# Altium schematic symbol library jlcpcb_2025_04_capacitors_extended_0805.schlib: 3281 symbols (part 9 of 18) (continued)
## CC0805JRX7R0BB472
designator C?  Capacitance: 4.7nF  (hidden comment: *)
Capacitor, Ceramic (MLCC), 4.7nF, ±5%, 100V, X7R, ±5%, SMD 0805; Manufacturer: YAGEO; Manufacturer Part Number: CC0805JRX7R0BB472; Package Size: 0805; JLCPCB Basic Part: No; JLCPCB Part Number: C309489; Supplier 1: LCSC; Category: Capacitors - MLCC; Supplier Part Number 1: C309489; Tolerance: ±5%; Voltage Rating: 100V; Temperature Coefficient: X7R; RoHS: Yes; ComponentLink1Description: Datasheet; ComponentLink1URL: https://wmsc.lcsc.com/wmsc/upload/file/pdf/v2/lcsc/2304140030_YAGEO-CC0805JRX7R0BB472_C309489.pdf; ComponentLink2Description: JLCPCB Part URL; ComponentLink2URL: https://jlcpcb.com/partdetail/C309489; ComponentLink3Description: LCSC Part URL; ComponentLink3URL: https://lcsc.com/product-detail/Multilayer-Ceramic-Capacitors-MLCC---SMD-SMT_YAGEO-YAGEO-CC0805JRX7R0BB472_C309489.html
footprint CAP-0805 (0805 (2012M) Capacitor)
pins: 1, 2

## CC0805JRX7R0BB822
designator C?  Capacitance: 8200pF  (hidden comment: *)
Capacitor, Ceramic (MLCC), 8200pF, ±5%, 100V, X7R, ±5%, SMD 0805; Manufacturer: YAGEO; Manufacturer Part Number: CC0805JRX7R0BB822; Package Size: 0805; JLCPCB Basic Part: No; JLCPCB Part Number: C576998; Supplier 1: LCSC; Category: Capacitors - MLCC; Supplier Part Number 1: C576998; Tolerance: ±5%; Voltage Rating: 100V; Temperature Coefficient: X7R; RoHS: Yes; ComponentLink1Description: Datasheet; ComponentLink1URL: https://wmsc.lcsc.com/wmsc/upload/file/pdf/v2/lcsc/2211281000_YAGEO-CC0805JRX7R0BB822_C576998.pdf; ComponentLink2Description: JLCPCB Part URL; ComponentLink2URL: https://jlcpcb.com/partdetail/C576998; ComponentLink3Description: LCSC Part URL; ComponentLink3URL: https://lcsc.com/product-detail/Multilayer-Ceramic-Capacitors-MLCC---SMD-SMT_YAGEO-YAGEO-CC0805JRX7R0BB822_C576998.html
footprint CAP-0805 (0805 (2012M) Capacitor)
pins: 1, 2

## CC0805JRX7R7BB104
designator C?  Capacitance: 100nF  (hidden comment: *)
Capacitor, Ceramic (MLCC), 100nF, ±5%, 16V, X7R, ±5%, SMD 0805; Manufacturer: YAGEO; Manufacturer Part Number: CC0805JRX7R7BB104; Package Size: 0805; JLCPCB Basic Part: No; JLCPCB Part Number: C520082; Supplier 1: LCSC; Category: Capacitors - MLCC; Supplier Part Number 1: C520082; Tolerance: ±5%; Voltage Rating: 16V; Temperature Coefficient: X7R; RoHS: Yes; ComponentLink1Description: Datasheet; ComponentLink1URL: https://wmsc.lcsc.com/wmsc/upload/file/pdf/v2/lcsc/2203311630_YAGEO-CC0805JRX7R7BB104_C520082.pdf; ComponentLink2Description: JLCPCB Part URL; ComponentLink2URL: https://jlcpcb.com/partdetail/C520082; ComponentLink3Description: LCSC Part URL; ComponentLink3URL: https://lcsc.com/product-detail/Multilayer-Ceramic-Capacitors-MLCC---SMD-SMT_YAGEO-YAGEO-CC0805JRX7R7BB104_C520082.html
footprint CAP-0805 (0805 (2012M) Capacitor)
pins: 1, 2

## CC0805JRX7R7BB224
designator C?  Capacitance: 220nF  (hidden comment: *)
Capacitor, Ceramic (MLCC), 220nF, ±5%, 16V, X7R, ±5%, SMD 0805; Manufacturer: YAGEO; Manufacturer Part Number: CC0805JRX7R7BB224; Package Size: 0805; JLCPCB Basic Part: No; JLCPCB Part Number: C541526; Supplier 1: LCSC; Category: Capacitors - MLCC; Supplier Part Number 1: C541526; Tolerance: ±5%; Voltage Rating: 16V; Temperature Coefficient: X7R; RoHS: Yes; ComponentLink1Description: Datasheet; ComponentLink1URL: https://wmsc.lcsc.com/wmsc/upload/file/pdf/v2/lcsc/2006151143_YAGEO-CC0805JRX7R7BB224_C541526.pdf; ComponentLink2Description: JLCPCB Part URL; ComponentLink2URL: https://jlcpcb.com/partdetail/C541526; ComponentLink3Description: LCSC Part URL; ComponentLink3URL: https://lcsc.com/product-detail/Multilayer-Ceramic-Capacitors-MLCC---SMD-SMT_YAGEO-YAGEO-CC0805JRX7R7BB224_C541526.html
footprint CAP-0805 (0805 (2012M) Capacitor)
pins: 1, 2

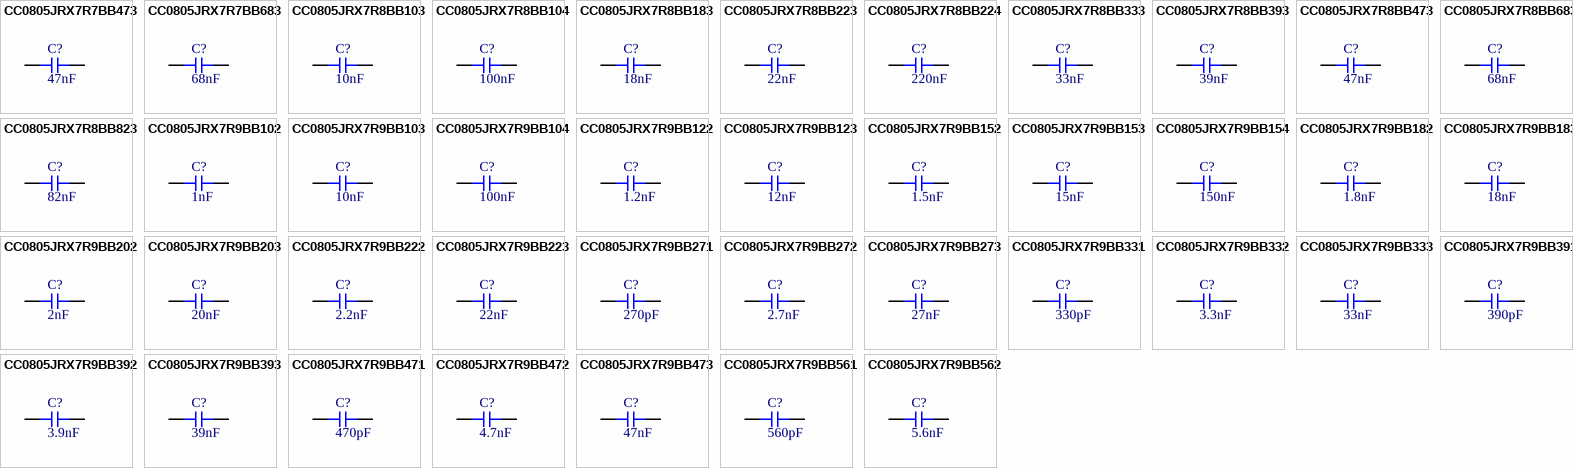
[diagram p38: symbols CC0805JRX7R7BB473 to CC0805JRX7R9BB562]

## CC0805JRX7R7BB473
designator C?  Capacitance: 47nF  (hidden comment: *)
Capacitor, Ceramic (MLCC), 47nF, ±5%, 16V, X7R, ±5%, SMD 0805; Manufacturer: YAGEO; Manufacturer Part Number: CC0805JRX7R7BB473; Package Size: 0805; JLCPCB Basic Part: No; JLCPCB Part Number: C520035; Supplier 1: LCSC; Category: Capacitors - MLCC; Supplier Part Number 1: C520035; Tolerance: ±5%; Voltage Rating: 16V; Temperature Coefficient: X7R; RoHS: Yes; ComponentLink1Description: Datasheet; ComponentLink1URL: https://wmsc.lcsc.com/wmsc/upload/file/pdf/v2/lcsc/2008191833_YAGEO-CC0805JRX7R7BB473_C520035.pdf; ComponentLink2Description: JLCPCB Part URL; ComponentLink2URL: https://jlcpcb.com/partdetail/C520035; ComponentLink3Description: LCSC Part URL; ComponentLink3URL: https://lcsc.com/product-detail/Multilayer-Ceramic-Capacitors-MLCC---SMD-SMT_YAGEO-YAGEO-CC0805JRX7R7BB473_C520035.html
footprint CAP-0805 (0805 (2012M) Capacitor)
pins: 1, 2

## CC0805JRX7R7BB683
designator C?  Capacitance: 68nF  (hidden comment: *)
Capacitor, Ceramic (MLCC), 68nF, ±5%, 16V, X7R, ±5%, SMD 0805; Manufacturer: YAGEO; Manufacturer Part Number: CC0805JRX7R7BB683; Package Size: 0805; JLCPCB Basic Part: No; JLCPCB Part Number: C520036; Supplier 1: LCSC; Category: Capacitors - MLCC; Supplier Part Number 1: C520036; Tolerance: ±5%; Voltage Rating: 16V; Temperature Coefficient: X7R; RoHS: Yes; ComponentLink1Description: Datasheet; ComponentLink1URL: https://wmsc.lcsc.com/wmsc/upload/file/pdf/v2/lcsc/2006011836_YAGEO-CC0805JRX7R7BB683_C520036.pdf; ComponentLink2Description: JLCPCB Part URL; ComponentLink2URL: https://jlcpcb.com/partdetail/C520036; ComponentLink3Description: LCSC Part URL; ComponentLink3URL: https://lcsc.com/product-detail/Multilayer-Ceramic-Capacitors-MLCC---SMD-SMT_YAGEO-YAGEO-CC0805JRX7R7BB683_C520036.html
footprint CAP-0805 (0805 (2012M) Capacitor)
pins: 1, 2

## CC0805JRX7R8BB103
designator C?  Capacitance: 10nF  (hidden comment: *)
Capacitor, Ceramic (MLCC), 10nF, ±5%, 25V, X7R, ±5%, SMD 0805; Manufacturer: YAGEO; Manufacturer Part Number: CC0805JRX7R8BB103; Package Size: 0805; JLCPCB Basic Part: No; JLCPCB Part Number: C520009; Supplier 1: LCSC; Category: Capacitors - MLCC; Supplier Part Number 1: C520009; Tolerance: ±5%; Voltage Rating: 25V; Temperature Coefficient: X7R; RoHS: Yes; ComponentLink1Description: Datasheet; ComponentLink1URL: https://wmsc.lcsc.com/wmsc/upload/file/pdf/v2/lcsc/2005181835_YAGEO-CC0805JRX7R8BB103_C520009.pdf; ComponentLink2Description: JLCPCB Part URL; ComponentLink2URL: https://jlcpcb.com/partdetail/C520009; ComponentLink3Description: LCSC Part URL; ComponentLink3URL: https://lcsc.com/product-detail/Multilayer-Ceramic-Capacitors-MLCC---SMD-SMT_YAGEO-YAGEO-CC0805JRX7R8BB103_C520009.html
footprint CAP-0805 (0805 (2012M) Capacitor)
pins: 1, 2

## CC0805JRX7R8BB104
designator C?  Capacitance: 100nF  (hidden comment: *)
Capacitor, Ceramic (MLCC), 100nF, ±5%, 25V, X7R, ±5%, SMD 0805; Manufacturer: YAGEO; Manufacturer Part Number: CC0805JRX7R8BB104; Package Size: 0805; JLCPCB Basic Part: No; JLCPCB Part Number: C520083; Supplier 1: LCSC; Category: Capacitors - MLCC; Supplier Part Number 1: C520083; Tolerance: ±5%; Voltage Rating: 25V; Temperature Coefficient: X7R; RoHS: Yes; ComponentLink1Description: Datasheet; ComponentLink1URL: https://wmsc.lcsc.com/wmsc/upload/file/pdf/v2/lcsc/2203311630_YAGEO-CC0805JRX7R8BB104_C520083.pdf; ComponentLink2Description: JLCPCB Part URL; ComponentLink2URL: https://jlcpcb.com/partdetail/C520083; ComponentLink3Description: LCSC Part URL; ComponentLink3URL: https://lcsc.com/product-detail/Multilayer-Ceramic-Capacitors-MLCC---SMD-SMT_YAGEO-YAGEO-CC0805JRX7R8BB104_C520083.html
footprint CAP-0805 (0805 (2012M) Capacitor)
pins: 1, 2

## CC0805JRX7R8BB183
designator C?  Capacitance: 18nF  (hidden comment: *)
Capacitor, Ceramic (MLCC), 18nF, ±5%, 25V, X7R, ±5%, SMD 0805; Manufacturer: YAGEO; Manufacturer Part Number: CC0805JRX7R8BB183; Package Size: 0805; JLCPCB Basic Part: No; JLCPCB Part Number: C520030; Supplier 1: LCSC; Category: Capacitors - MLCC; Supplier Part Number 1: C520030; Tolerance: ±5%; Voltage Rating: 25V; Temperature Coefficient: X7R; RoHS: Yes; ComponentLink1Description: Datasheet; ComponentLink1URL: https://wmsc.lcsc.com/wmsc/upload/file/pdf/v2/lcsc/2012162139_YAGEO-CC0805JRX7R8BB183_C520030.pdf; ComponentLink2Description: JLCPCB Part URL; ComponentLink2URL: https://jlcpcb.com/partdetail/C520030; ComponentLink3Description: LCSC Part URL; ComponentLink3URL: https://lcsc.com/product-detail/Multilayer-Ceramic-Capacitors-MLCC---SMD-SMT_YAGEO-YAGEO-CC0805JRX7R8BB183_C520030.html
footprint CAP-0805 (0805 (2012M) Capacitor)
pins: 1, 2

## CC0805JRX7R8BB223
designator C?  Capacitance: 22nF  (hidden comment: *)
Capacitor, Ceramic (MLCC), 22nF, ±5%, 25V, X7R, ±5%, SMD 0805; Manufacturer: YAGEO; Manufacturer Part Number: CC0805JRX7R8BB223; Package Size: 0805; JLCPCB Basic Part: No; JLCPCB Part Number: C520037; Supplier 1: LCSC; Category: Capacitors - MLCC; Supplier Part Number 1: C520037; Tolerance: ±5%; Voltage Rating: 25V; Temperature Coefficient: X7R; RoHS: Yes; ComponentLink1Description: Datasheet; ComponentLink1URL: https://wmsc.lcsc.com/wmsc/upload/file/pdf/v2/lcsc/2008031233_YAGEO-CC0805JRX7R8BB223_C520037.pdf; ComponentLink2Description: JLCPCB Part URL; ComponentLink2URL: https://jlcpcb.com/partdetail/C520037; ComponentLink3Description: LCSC Part URL; ComponentLink3URL: https://lcsc.com/product-detail/Multilayer-Ceramic-Capacitors-MLCC---SMD-SMT_YAGEO-YAGEO-CC0805JRX7R8BB223_C520037.html
footprint CAP-0805 (0805 (2012M) Capacitor)
pins: 1, 2

## CC0805JRX7R8BB224
designator C?  Capacitance: 220nF  (hidden comment: *)
Capacitor, Ceramic (MLCC), 220nF, ±5%, 25V, X7R, ±5%, SMD 0805; Manufacturer: YAGEO; Manufacturer Part Number: CC0805JRX7R8BB224; Package Size: 0805; JLCPCB Basic Part: No; JLCPCB Part Number: C541527; Supplier 1: LCSC; Category: Capacitors - MLCC; Supplier Part Number 1: C541527; Tolerance: ±5%; Voltage Rating: 25V; Temperature Coefficient: X7R; RoHS: Yes; ComponentLink1Description: Datasheet; ComponentLink1URL: https://wmsc.lcsc.com/wmsc/upload/file/pdf/v2/lcsc/2006151143_YAGEO-CC0805JRX7R8BB224_C541527.pdf; ComponentLink2Description: JLCPCB Part URL; ComponentLink2URL: https://jlcpcb.com/partdetail/C541527; ComponentLink3Description: LCSC Part URL; ComponentLink3URL: https://lcsc.com/product-detail/Multilayer-Ceramic-Capacitors-MLCC---SMD-SMT_YAGEO-YAGEO-CC0805JRX7R8BB224_C541527.html
footprint CAP-0805 (0805 (2012M) Capacitor)
pins: 1, 2

## CC0805JRX7R8BB333
designator C?  Capacitance: 33nF  (hidden comment: *)
Capacitor, Ceramic (MLCC), 33nF, ±5%, 25V, X7R, ±5%, SMD 0805; Manufacturer: YAGEO; Manufacturer Part Number: CC0805JRX7R8BB333; Package Size: 0805; JLCPCB Basic Part: No; JLCPCB Part Number: C520038; Supplier 1: LCSC; Category: Capacitors - MLCC; Supplier Part Number 1: C520038; Tolerance: ±5%; Voltage Rating: 25V; Temperature Coefficient: X7R; RoHS: Yes; ComponentLink1Description: Datasheet; ComponentLink1URL: https://wmsc.lcsc.com/wmsc/upload/file/pdf/v2/lcsc/2007231535_YAGEO-CC0805JRX7R8BB333_C520038.pdf; ComponentLink2Description: JLCPCB Part URL; ComponentLink2URL: https://jlcpcb.com/partdetail/C520038; ComponentLink3Description: LCSC Part URL; ComponentLink3URL: https://lcsc.com/product-detail/Multilayer-Ceramic-Capacitors-MLCC---SMD-SMT_YAGEO-YAGEO-CC0805JRX7R8BB333_C520038.html
footprint CAP-0805 (0805 (2012M) Capacitor)
pins: 1, 2

## CC0805JRX7R8BB393
designator C?  Capacitance: 39nF  (hidden comment: *)
Capacitor, Ceramic (MLCC), 39nF, ±5%, 25V, X7R, ±5%, SMD 0805; Manufacturer: YAGEO; Manufacturer Part Number: CC0805JRX7R8BB393; Package Size: 0805; JLCPCB Basic Part: No; JLCPCB Part Number: C1853547; Supplier 1: LCSC; Category: Capacitors - MLCC; Supplier Part Number 1: C1853547; Tolerance: ±5%; Voltage Rating: 25V; Temperature Coefficient: X7R; RoHS: Yes; ComponentLink1Description: Datasheet; ComponentLink1URL: https://wmsc.lcsc.com/wmsc/upload/file/pdf/v2/lcsc/2201271100_YAGEO-CC0805JRX7R8BB393_C1853547.pdf; ComponentLink2Description: JLCPCB Part URL; ComponentLink2URL: https://jlcpcb.com/partdetail/C1853547; ComponentLink3Description: LCSC Part URL; ComponentLink3URL: https://lcsc.com/product-detail/Multilayer-Ceramic-Capacitors-MLCC---SMD-SMT_YAGEO-YAGEO-CC0805JRX7R8BB393_C1853547.html
footprint CAP-0805 (0805 (2012M) Capacitor)
pins: 1, 2

## CC0805JRX7R8BB473
designator C?  Capacitance: 47nF  (hidden comment: *)
Capacitor, Ceramic (MLCC), 47nF, ±5%, 25V, X7R, ±5%, SMD 0805; Manufacturer: YAGEO; Manufacturer Part Number: CC0805JRX7R8BB473; Package Size: 0805; JLCPCB Basic Part: No; JLCPCB Part Number: C520039; Supplier 1: LCSC; Category: Capacitors - MLCC; Supplier Part Number 1: C520039; Tolerance: ±5%; Voltage Rating: 25V; Temperature Coefficient: X7R; RoHS: Yes; ComponentLink1Description: Datasheet; ComponentLink1URL: https://wmsc.lcsc.com/wmsc/upload/file/pdf/v2/lcsc/2008191833_YAGEO-CC0805JRX7R8BB473_C520039.pdf; ComponentLink2Description: JLCPCB Part URL; ComponentLink2URL: https://jlcpcb.com/partdetail/C520039; ComponentLink3Description: LCSC Part URL; ComponentLink3URL: https://lcsc.com/product-detail/Multilayer-Ceramic-Capacitors-MLCC---SMD-SMT_YAGEO-YAGEO-CC0805JRX7R8BB473_C520039.html
footprint CAP-0805 (0805 (2012M) Capacitor)
pins: 1, 2

## CC0805JRX7R8BB683
designator C?  Capacitance: 68nF  (hidden comment: *)
Capacitor, Ceramic (MLCC), 68nF, ±5%, 25V, X7R, ±5%, SMD 0805; Manufacturer: YAGEO; Manufacturer Part Number: CC0805JRX7R8BB683; Package Size: 0805; JLCPCB Basic Part: No; JLCPCB Part Number: C520040; Supplier 1: LCSC; Category: Capacitors - MLCC; Supplier Part Number 1: C520040; Tolerance: ±5%; Voltage Rating: 25V; Temperature Coefficient: X7R; RoHS: Yes; ComponentLink1Description: Datasheet; ComponentLink1URL: https://wmsc.lcsc.com/wmsc/upload/file/pdf/v2/lcsc/2006011836_YAGEO-CC0805JRX7R8BB683_C520040.pdf; ComponentLink2Description: JLCPCB Part URL; ComponentLink2URL: https://jlcpcb.com/partdetail/C520040; ComponentLink3Description: LCSC Part URL; ComponentLink3URL: https://lcsc.com/product-detail/Multilayer-Ceramic-Capacitors-MLCC---SMD-SMT_YAGEO-YAGEO-CC0805JRX7R8BB683_C520040.html
footprint CAP-0805 (0805 (2012M) Capacitor)
pins: 1, 2

## CC0805JRX7R8BB823
designator C?  Capacitance: 82nF  (hidden comment: *)
Capacitor, Ceramic (MLCC), 82nF, ±5%, 25V, X7R, ±5%, SMD 0805; Manufacturer: YAGEO; Manufacturer Part Number: CC0805JRX7R8BB823; Package Size: 0805; JLCPCB Basic Part: No; JLCPCB Part Number: C520041; Supplier 1: LCSC; Category: Capacitors - MLCC; Supplier Part Number 1: C520041; Tolerance: ±5%; Voltage Rating: 25V; Temperature Coefficient: X7R; RoHS: Yes; ComponentLink1Description: Datasheet; ComponentLink1URL: https://wmsc.lcsc.com/wmsc/upload/file/pdf/v2/lcsc/2012162139_YAGEO-CC0805JRX7R8BB823_C520041.pdf; ComponentLink2Description: JLCPCB Part URL; ComponentLink2URL: https://jlcpcb.com/partdetail/C520041; ComponentLink3Description: LCSC Part URL; ComponentLink3URL: https://lcsc.com/product-detail/Multilayer-Ceramic-Capacitors-MLCC---SMD-SMT_YAGEO-YAGEO-CC0805JRX7R8BB823_C520041.html
footprint CAP-0805 (0805 (2012M) Capacitor)
pins: 1, 2

## CC0805JRX7R9BB102
designator C?  Capacitance: 1nF  (hidden comment: *)
Capacitor, Ceramic (MLCC), 1nF, ±5%, 50V, X7R, ±5%, SMD 0805; Manufacturer: YAGEO; Manufacturer Part Number: CC0805JRX7R9BB102; Package Size: 0805; JLCPCB Basic Part: No; JLCPCB Part Number: C277515; Supplier 1: LCSC; Category: Capacitors - MLCC; Supplier Part Number 1: C277515; Tolerance: ±5%; Voltage Rating: 50V; Temperature Coefficient: X7R; RoHS: Yes; ComponentLink1Description: Datasheet; ComponentLink1URL: https://wmsc.lcsc.com/wmsc/upload/file/pdf/v2/lcsc/2304140030_YAGEO-CC0805JRX7R9BB102_C277515.pdf; ComponentLink2Description: JLCPCB Part URL; ComponentLink2URL: https://jlcpcb.com/partdetail/C277515; ComponentLink3Description: LCSC Part URL; ComponentLink3URL: https://lcsc.com/product-detail/Multilayer-Ceramic-Capacitors-MLCC---SMD-SMT_YAGEO-YAGEO-CC0805JRX7R9BB102_C277515.html
footprint CAP-0805 (0805 (2012M) Capacitor)
pins: 1, 2

## CC0805JRX7R9BB103
designator C?  Capacitance: 10nF  (hidden comment: *)
Capacitor, Ceramic (MLCC), 10nF, ±5%, 50V, X7R, ±5%, SMD 0805; Manufacturer: YAGEO; Manufacturer Part Number: CC0805JRX7R9BB103; Package Size: 0805; JLCPCB Basic Part: No; JLCPCB Part Number: C58456; Supplier 1: LCSC; Category: Capacitors - MLCC; Supplier Part Number 1: C58456; Tolerance: ±5%; Voltage Rating: 50V; Temperature Coefficient: X7R; RoHS: Yes; ComponentLink1Description: Datasheet; ComponentLink1URL: https://wmsc.lcsc.com/wmsc/upload/file/pdf/v2/lcsc/2304140030_YAGEO-CC0805JRX7R9BB103_C58456.pdf; ComponentLink2Description: JLCPCB Part URL; ComponentLink2URL: https://jlcpcb.com/partdetail/C58456; ComponentLink3Description: LCSC Part URL; ComponentLink3URL: https://lcsc.com/product-detail/Multilayer-Ceramic-Capacitors-MLCC---SMD-SMT_YAGEO-YAGEO-CC0805JRX7R9BB103_C58456.html
footprint CAP-0805 (0805 (2012M) Capacitor)
pins: 1, 2

## CC0805JRX7R9BB104
designator C?  Capacitance: 100nF  (hidden comment: *)
Capacitor, Ceramic (MLCC), 100nF, ±5%, 50V, X7R, ±5%, SMD 0805; Manufacturer: YAGEO; Manufacturer Part Number: CC0805JRX7R9BB104; Package Size: 0805; JLCPCB Basic Part: No; JLCPCB Part Number: C111492; Supplier 1: LCSC; Category: Capacitors - MLCC; Supplier Part Number 1: C111492; Tolerance: ±5%; Voltage Rating: 50V; Temperature Coefficient: X7R; RoHS: Yes; ComponentLink1Description: Datasheet; ComponentLink1URL: https://wmsc.lcsc.com/wmsc/upload/file/pdf/v2/lcsc/1811061632_YAGEO-CC0805JRX7R9BB104_C111492.pdf; ComponentLink2Description: JLCPCB Part URL; ComponentLink2URL: https://jlcpcb.com/partdetail/C111492; ComponentLink3Description: LCSC Part URL; ComponentLink3URL: https://lcsc.com/product-detail/Multilayer-Ceramic-Capacitors-MLCC---SMD-SMT_YAGEO-YAGEO-CC0805JRX7R9BB104_C111492.html
footprint CAP-0805 (0805 (2012M) Capacitor)
pins: 1, 2

## CC0805JRX7R9BB122
designator C?  Capacitance: 1.2nF  (hidden comment: *)
Capacitor, Ceramic (MLCC), 1.2nF, ±5%, 50V, X7R, ±5%, SMD 0805; Manufacturer: YAGEO; Manufacturer Part Number: CC0805JRX7R9BB122; Package Size: 0805; JLCPCB Basic Part: No; JLCPCB Part Number: C520020; Supplier 1: LCSC; Category: Capacitors - MLCC; Supplier Part Number 1: C520020; Tolerance: ±5%; Voltage Rating: 50V; Temperature Coefficient: X7R; RoHS: Yes; ComponentLink1Description: Datasheet; ComponentLink1URL: https://wmsc.lcsc.com/wmsc/upload/file/pdf/v2/lcsc/2007231534_YAGEO-CC0805JRX7R9BB122_C520020.pdf; ComponentLink2Description: JLCPCB Part URL; ComponentLink2URL: https://jlcpcb.com/partdetail/C520020; ComponentLink3Description: LCSC Part URL; ComponentLink3URL: https://lcsc.com/product-detail/Multilayer-Ceramic-Capacitors-MLCC---SMD-SMT_YAGEO-YAGEO-CC0805JRX7R9BB122_C520020.html
footprint CAP-0805 (0805 (2012M) Capacitor)
pins: 1, 2

## CC0805JRX7R9BB123
designator C?  Capacitance: 12nF  (hidden comment: *)
Capacitor, Ceramic (MLCC), 12nF, ±5%, 50V, X7R, ±5%, SMD 0805; Manufacturer: YAGEO; Manufacturer Part Number: CC0805JRX7R9BB123; Package Size: 0805; JLCPCB Basic Part: No; JLCPCB Part Number: C520031; Supplier 1: LCSC; Category: Capacitors - MLCC; Supplier Part Number 1: C520031; Tolerance: ±5%; Voltage Rating: 50V; Temperature Coefficient: X7R; RoHS: Yes; ComponentLink1Description: Datasheet; ComponentLink1URL: https://wmsc.lcsc.com/wmsc/upload/file/pdf/v2/lcsc/2006011836_YAGEO-CC0805JRX7R9BB123_C520031.pdf; ComponentLink2Description: JLCPCB Part URL; ComponentLink2URL: https://jlcpcb.com/partdetail/C520031; ComponentLink3Description: LCSC Part URL; ComponentLink3URL: https://lcsc.com/product-detail/Multilayer-Ceramic-Capacitors-MLCC---SMD-SMT_YAGEO-YAGEO-CC0805JRX7R9BB123_C520031.html
footprint CAP-0805 (0805 (2012M) Capacitor)
pins: 1, 2

## CC0805JRX7R9BB152
designator C?  Capacitance: 1.5nF  (hidden comment: *)
Capacitor, Ceramic (MLCC), 1.5nF, ±5%, 50V, X7R, ±5%, SMD 0805; Manufacturer: YAGEO; Manufacturer Part Number: CC0805JRX7R9BB152; Package Size: 0805; JLCPCB Basic Part: No; JLCPCB Part Number: C520010; Supplier 1: LCSC; Category: Capacitors - MLCC; Supplier Part Number 1: C520010; Tolerance: ±5%; Voltage Rating: 50V; Temperature Coefficient: X7R; RoHS: Yes; ComponentLink1Description: Datasheet; ComponentLink1URL: https://wmsc.lcsc.com/wmsc/upload/file/pdf/v2/lcsc/2007231534_YAGEO-CC0805JRX7R9BB152_C520010.pdf; ComponentLink2Description: JLCPCB Part URL; ComponentLink2URL: https://jlcpcb.com/partdetail/C520010; ComponentLink3Description: LCSC Part URL; ComponentLink3URL: https://lcsc.com/product-detail/Multilayer-Ceramic-Capacitors-MLCC---SMD-SMT_YAGEO-YAGEO-CC0805JRX7R9BB152_C520010.html
footprint CAP-0805 (0805 (2012M) Capacitor)
pins: 1, 2

## CC0805JRX7R9BB153
designator C?  Capacitance: 15nF  (hidden comment: *)
Capacitor, Ceramic (MLCC), 15nF, ±5%, 50V, X7R, ±5%, SMD 0805; Manufacturer: YAGEO; Manufacturer Part Number: CC0805JRX7R9BB153; Package Size: 0805; JLCPCB Basic Part: No; JLCPCB Part Number: C520016; Supplier 1: LCSC; Category: Capacitors - MLCC; Supplier Part Number 1: C520016; Tolerance: ±5%; Voltage Rating: 50V; Temperature Coefficient: X7R; RoHS: Yes; ComponentLink1Description: Datasheet; ComponentLink1URL: https://wmsc.lcsc.com/wmsc/upload/file/pdf/v2/lcsc/2005141204_YAGEO-CC0805JRX7R9BB153_C520016.pdf; ComponentLink2Description: JLCPCB Part URL; ComponentLink2URL: https://jlcpcb.com/partdetail/C520016; ComponentLink3Description: LCSC Part URL; ComponentLink3URL: https://lcsc.com/product-detail/Multilayer-Ceramic-Capacitors-MLCC---SMD-SMT_YAGEO-YAGEO-CC0805JRX7R9BB153_C520016.html
footprint CAP-0805 (0805 (2012M) Capacitor)
pins: 1, 2

## CC0805JRX7R9BB154
designator C?  Capacitance: 150nF  (hidden comment: *)
Capacitor, Ceramic (MLCC), 150nF, ±5%, 50V, X7R, ±5%, SMD 0805; Manufacturer: YAGEO; Manufacturer Part Number: CC0805JRX7R9BB154; Package Size: 0805; JLCPCB Basic Part: No; JLCPCB Part Number: C541525; Supplier 1: LCSC; Category: Capacitors - MLCC; Supplier Part Number 1: C541525; Tolerance: ±5%; Voltage Rating: 50V; Temperature Coefficient: X7R; RoHS: Yes; ComponentLink1Description: Datasheet; ComponentLink1URL: https://wmsc.lcsc.com/wmsc/upload/file/pdf/v2/lcsc/2006151143_YAGEO-CC0805JRX7R9BB154_C541525.pdf; ComponentLink2Description: JLCPCB Part URL; ComponentLink2URL: https://jlcpcb.com/partdetail/C541525; ComponentLink3Description: LCSC Part URL; ComponentLink3URL: https://lcsc.com/product-detail/Multilayer-Ceramic-Capacitors-MLCC---SMD-SMT_YAGEO-YAGEO-CC0805JRX7R9BB154_C541525.html
footprint CAP-0805 (0805 (2012M) Capacitor)
pins: 1, 2

## CC0805JRX7R9BB182
designator C?  Capacitance: 1.8nF  (hidden comment: *)
Capacitor, Ceramic (MLCC), 1.8nF, ±5%, 50V, X7R, ±5%, SMD 0805; Manufacturer: YAGEO; Manufacturer Part Number: CC0805JRX7R9BB182; Package Size: 0805; JLCPCB Basic Part: No; JLCPCB Part Number: C520021; Supplier 1: LCSC; Category: Capacitors - MLCC; Supplier Part Number 1: C520021; Tolerance: ±5%; Voltage Rating: 50V; Temperature Coefficient: X7R; RoHS: Yes; ComponentLink1Description: Datasheet; ComponentLink1URL: https://wmsc.lcsc.com/wmsc/upload/file/pdf/v2/lcsc/2007161235_YAGEO-CC0805JRX7R9BB182_C520021.pdf; ComponentLink2Description: JLCPCB Part URL; ComponentLink2URL: https://jlcpcb.com/partdetail/C520021; ComponentLink3Description: LCSC Part URL; ComponentLink3URL: https://lcsc.com/product-detail/Multilayer-Ceramic-Capacitors-MLCC---SMD-SMT_YAGEO-YAGEO-CC0805JRX7R9BB182_C520021.html
footprint CAP-0805 (0805 (2012M) Capacitor)
pins: 1, 2

## CC0805JRX7R9BB183
designator C?  Capacitance: 18nF  (hidden comment: *)
Capacitor, Ceramic (MLCC), 18nF, ±5%, 50V, X7R, ±5%, SMD 0805; Manufacturer: YAGEO; Manufacturer Part Number: CC0805JRX7R9BB183; Package Size: 0805; JLCPCB Basic Part: No; JLCPCB Part Number: C520032; Supplier 1: LCSC; Category: Capacitors - MLCC; Supplier Part Number 1: C520032; Tolerance: ±5%; Voltage Rating: 50V; Temperature Coefficient: X7R; RoHS: Yes; ComponentLink1Description: Datasheet; ComponentLink1URL: https://wmsc.lcsc.com/wmsc/upload/file/pdf/v2/lcsc/2006011836_YAGEO-CC0805JRX7R9BB183_C520032.pdf; ComponentLink2Description: JLCPCB Part URL; ComponentLink2URL: https://jlcpcb.com/partdetail/C520032; ComponentLink3Description: LCSC Part URL; ComponentLink3URL: https://lcsc.com/product-detail/Multilayer-Ceramic-Capacitors-MLCC---SMD-SMT_YAGEO-YAGEO-CC0805JRX7R9BB183_C520032.html
footprint CAP-0805 (0805 (2012M) Capacitor)
pins: 1, 2

## CC0805JRX7R9BB202
designator C?  Capacitance: 2nF  (hidden comment: *)
Capacitor, Ceramic (MLCC), 2nF, ±5%, 50V, X7R, ±5%, SMD 0805; Manufacturer: YAGEO; Manufacturer Part Number: CC0805JRX7R9BB202; Package Size: 0805; JLCPCB Basic Part: No; JLCPCB Part Number: C520022; Supplier 1: LCSC; Category: Capacitors - MLCC; Supplier Part Number 1: C520022; Tolerance: ±5%; Voltage Rating: 50V; Temperature Coefficient: X7R; RoHS: Yes; ComponentLink1Description: Datasheet; ComponentLink1URL: https://wmsc.lcsc.com/wmsc/upload/file/pdf/v2/lcsc/2006011836_YAGEO-CC0805JRX7R9BB202_C520022.pdf; ComponentLink2Description: JLCPCB Part URL; ComponentLink2URL: https://jlcpcb.com/partdetail/C520022; ComponentLink3Description: LCSC Part URL; ComponentLink3URL: https://lcsc.com/product-detail/Multilayer-Ceramic-Capacitors-MLCC---SMD-SMT_YAGEO-YAGEO-CC0805JRX7R9BB202_C520022.html
footprint CAP-0805 (0805 (2012M) Capacitor)
pins: 1, 2

## CC0805JRX7R9BB203
designator C?  Capacitance: 20nF  (hidden comment: *)
Capacitor, Ceramic (MLCC), 20nF, ±5%, 50V, X7R, ±5%, SMD 0805; Manufacturer: YAGEO; Manufacturer Part Number: CC0805JRX7R9BB203; Package Size: 0805; JLCPCB Basic Part: No; JLCPCB Part Number: C1853321; Supplier 1: LCSC; Category: Capacitors - MLCC; Supplier Part Number 1: C1853321; Tolerance: ±5%; Voltage Rating: 50V; Temperature Coefficient: X7R; RoHS: Yes; ComponentLink1Description: Datasheet; ComponentLink1URL: https://wmsc.lcsc.com/wmsc/upload/file/pdf/v2/lcsc/2201271030_YAGEO-CC0805JRX7R9BB203_C1853321.pdf; ComponentLink2Description: JLCPCB Part URL; ComponentLink2URL: https://jlcpcb.com/partdetail/C1853321; ComponentLink3Description: LCSC Part URL; ComponentLink3URL: https://lcsc.com/product-detail/Multilayer-Ceramic-Capacitors-MLCC---SMD-SMT_YAGEO-YAGEO-CC0805JRX7R9BB203_C1853321.html
footprint CAP-0805 (0805 (2012M) Capacitor)
pins: 1, 2

## CC0805JRX7R9BB222
designator C?  Capacitance: 2.2nF  (hidden comment: *)
Capacitor, Ceramic (MLCC), 2.2nF, ±5%, 50V, X7R, ±5%, SMD 0805; Manufacturer: YAGEO; Manufacturer Part Number: CC0805JRX7R9BB222; Package Size: 0805; JLCPCB Basic Part: No; JLCPCB Part Number: C513578; Supplier 1: LCSC; Category: Capacitors - MLCC; Supplier Part Number 1: C513578; Tolerance: ±5%; Voltage Rating: 50V; Temperature Coefficient: X7R; RoHS: Yes; ComponentLink1Description: Datasheet; ComponentLink1URL: https://wmsc.lcsc.com/wmsc/upload/file/pdf/v2/lcsc/2004231432_YAGEO-CC0805JRX7R9BB222_C513578.pdf; ComponentLink2Description: JLCPCB Part URL; ComponentLink2URL: https://jlcpcb.com/partdetail/C513578; ComponentLink3Description: LCSC Part URL; ComponentLink3URL: https://lcsc.com/product-detail/Multilayer-Ceramic-Capacitors-MLCC---SMD-SMT_YAGEO-YAGEO-CC0805JRX7R9BB222_C513578.html
footprint CAP-0805 (0805 (2012M) Capacitor)
pins: 1, 2

## CC0805JRX7R9BB223
designator C?  Capacitance: 22nF  (hidden comment: *)
Capacitor, Ceramic (MLCC), 22nF, ±5%, 50V, X7R, ±5%, SMD 0805; Manufacturer: YAGEO; Manufacturer Part Number: CC0805JRX7R9BB223; Package Size: 0805; JLCPCB Basic Part: No; JLCPCB Part Number: C389104; Supplier 1: LCSC; Category: Capacitors - MLCC; Supplier Part Number 1: C389104; Tolerance: ±5%; Voltage Rating: 50V; Temperature Coefficient: X7R; RoHS: Yes; ComponentLink1Description: Datasheet; ComponentLink1URL: https://wmsc.lcsc.com/wmsc/upload/file/pdf/v2/lcsc/1912111437_YAGEO-CC0805JRX7R9BB223_C389104.pdf; ComponentLink2Description: JLCPCB Part URL; ComponentLink2URL: https://jlcpcb.com/partdetail/C389104; ComponentLink3Description: LCSC Part URL; ComponentLink3URL: https://lcsc.com/product-detail/Multilayer-Ceramic-Capacitors-MLCC---SMD-SMT_YAGEO-YAGEO-CC0805JRX7R9BB223_C389104.html
footprint CAP-0805 (0805 (2012M) Capacitor)
pins: 1, 2

## CC0805JRX7R9BB271
designator C?  Capacitance: 270pF  (hidden comment: *)
Capacitor, Ceramic (MLCC), 270pF, ±5%, 50V, X7R, ±5%, SMD 0805; Manufacturer: YAGEO; Manufacturer Part Number: CC0805JRX7R9BB271; Package Size: 0805; JLCPCB Basic Part: No; JLCPCB Part Number: C520023; Supplier 1: LCSC; Category: Capacitors - MLCC; Supplier Part Number 1: C520023; Tolerance: ±5%; Voltage Rating: 50V; Temperature Coefficient: X7R; RoHS: Yes; ComponentLink1Description: Datasheet; ComponentLink1URL: https://wmsc.lcsc.com/wmsc/upload/file/pdf/v2/lcsc/2012162139_YAGEO-CC0805JRX7R9BB271_C520023.pdf; ComponentLink2Description: JLCPCB Part URL; ComponentLink2URL: https://jlcpcb.com/partdetail/C520023; ComponentLink3Description: LCSC Part URL; ComponentLink3URL: https://lcsc.com/product-detail/Multilayer-Ceramic-Capacitors-MLCC---SMD-SMT_YAGEO-YAGEO-CC0805JRX7R9BB271_C520023.html
footprint CAP-0805 (0805 (2012M) Capacitor)
pins: 1, 2

## CC0805JRX7R9BB272
designator C?  Capacitance: 2.7nF  (hidden comment: *)
Capacitor, Ceramic (MLCC), 2.7nF, ±5%, 50V, X7R, ±5%, SMD 0805; Manufacturer: YAGEO; Manufacturer Part Number: CC0805JRX7R9BB272; Package Size: 0805; JLCPCB Basic Part: No; JLCPCB Part Number: C520024; Supplier 1: LCSC; Category: Capacitors - MLCC; Supplier Part Number 1: C520024; Tolerance: ±5%; Voltage Rating: 50V; Temperature Coefficient: X7R; RoHS: Yes; ComponentLink1Description: Datasheet; ComponentLink1URL: https://wmsc.lcsc.com/wmsc/upload/file/pdf/v2/lcsc/2006011836_YAGEO-CC0805JRX7R9BB272_C520024.pdf; ComponentLink2Description: JLCPCB Part URL; ComponentLink2URL: https://jlcpcb.com/partdetail/C520024; ComponentLink3Description: LCSC Part URL; ComponentLink3URL: https://lcsc.com/product-detail/Multilayer-Ceramic-Capacitors-MLCC---SMD-SMT_YAGEO-YAGEO-CC0805JRX7R9BB272_C520024.html
footprint CAP-0805 (0805 (2012M) Capacitor)
pins: 1, 2

## CC0805JRX7R9BB273
designator C?  Capacitance: 27nF  (hidden comment: *)
Capacitor, Ceramic (MLCC), 27nF, ±5%, 50V, X7R, ±5%, SMD 0805; Manufacturer: YAGEO; Manufacturer Part Number: CC0805JRX7R9BB273; Package Size: 0805; JLCPCB Basic Part: No; JLCPCB Part Number: C520042; Supplier 1: LCSC; Category: Capacitors - MLCC; Supplier Part Number 1: C520042; Tolerance: ±5%; Voltage Rating: 50V; Temperature Coefficient: X7R; RoHS: Yes; ComponentLink1Description: Datasheet; ComponentLink1URL: https://wmsc.lcsc.com/wmsc/upload/file/pdf/v2/lcsc/2006011836_YAGEO-CC0805JRX7R9BB273_C520042.pdf; ComponentLink2Description: JLCPCB Part URL; ComponentLink2URL: https://jlcpcb.com/partdetail/C520042; ComponentLink3Description: LCSC Part URL; ComponentLink3URL: https://lcsc.com/product-detail/Multilayer-Ceramic-Capacitors-MLCC---SMD-SMT_YAGEO-YAGEO-CC0805JRX7R9BB273_C520042.html
footprint CAP-0805 (0805 (2012M) Capacitor)
pins: 1, 2

## CC0805JRX7R9BB331
designator C?  Capacitance: 330pF  (hidden comment: *)
Capacitor, Ceramic (MLCC), 330pF, ±5%, 50V, X7R, ±5%, SMD 0805; Manufacturer: YAGEO; Manufacturer Part Number: CC0805JRX7R9BB331; Package Size: 0805; JLCPCB Basic Part: No; JLCPCB Part Number: C520011; Supplier 1: LCSC; Category: Capacitors - MLCC; Supplier Part Number 1: C520011; Tolerance: ±5%; Voltage Rating: 50V; Temperature Coefficient: X7R; RoHS: Yes; ComponentLink1Description: Datasheet; ComponentLink1URL: https://wmsc.lcsc.com/wmsc/upload/file/pdf/v2/lcsc/2008031233_YAGEO-CC0805JRX7R9BB331_C520011.pdf; ComponentLink2Description: JLCPCB Part URL; ComponentLink2URL: https://jlcpcb.com/partdetail/C520011; ComponentLink3Description: LCSC Part URL; ComponentLink3URL: https://lcsc.com/product-detail/Multilayer-Ceramic-Capacitors-MLCC---SMD-SMT_YAGEO-YAGEO-CC0805JRX7R9BB331_C520011.html
footprint CAP-0805 (0805 (2012M) Capacitor)
pins: 1, 2

## CC0805JRX7R9BB332
designator C?  Capacitance: 3.3nF  (hidden comment: *)
Capacitor, Ceramic (MLCC), 3.3nF, ±5%, 50V, X7R, ±5%, SMD 0805; Manufacturer: YAGEO; Manufacturer Part Number: CC0805JRX7R9BB332; Package Size: 0805; JLCPCB Basic Part: No; JLCPCB Part Number: C520012; Supplier 1: LCSC; Category: Capacitors - MLCC; Supplier Part Number 1: C520012; Tolerance: ±5%; Voltage Rating: 50V; Temperature Coefficient: X7R; RoHS: Yes; ComponentLink1Description: Datasheet; ComponentLink1URL: https://wmsc.lcsc.com/wmsc/upload/file/pdf/v2/lcsc/2006011836_YAGEO-CC0805JRX7R9BB332_C520012.pdf; ComponentLink2Description: JLCPCB Part URL; ComponentLink2URL: https://jlcpcb.com/partdetail/C520012; ComponentLink3Description: LCSC Part URL; ComponentLink3URL: https://lcsc.com/product-detail/Multilayer-Ceramic-Capacitors-MLCC---SMD-SMT_YAGEO-YAGEO-CC0805JRX7R9BB332_C520012.html
footprint CAP-0805 (0805 (2012M) Capacitor)
pins: 1, 2

## CC0805JRX7R9BB333
designator C?  Capacitance: 33nF  (hidden comment: *)
Capacitor, Ceramic (MLCC), 33nF, ±5%, 50V, X7R, ±5%, SMD 0805; Manufacturer: YAGEO; Manufacturer Part Number: CC0805JRX7R9BB333; Package Size: 0805; JLCPCB Basic Part: No; JLCPCB Part Number: C520043; Supplier 1: LCSC; Category: Capacitors - MLCC; Supplier Part Number 1: C520043; Tolerance: ±5%; Voltage Rating: 50V; Temperature Coefficient: X7R; RoHS: Yes; ComponentLink1Description: Datasheet; ComponentLink1URL: https://wmsc.lcsc.com/wmsc/upload/file/pdf/v2/lcsc/2008122133_YAGEO-CC0805JRX7R9BB333_C520043.pdf; ComponentLink2Description: JLCPCB Part URL; ComponentLink2URL: https://jlcpcb.com/partdetail/C520043; ComponentLink3Description: LCSC Part URL; ComponentLink3URL: https://lcsc.com/product-detail/Multilayer-Ceramic-Capacitors-MLCC---SMD-SMT_YAGEO-YAGEO-CC0805JRX7R9BB333_C520043.html
footprint CAP-0805 (0805 (2012M) Capacitor)
pins: 1, 2

## CC0805JRX7R9BB391
designator C?  Capacitance: 390pF  (hidden comment: *)
Capacitor, Ceramic (MLCC), 390pF, ±5%, 50V, X7R, ±5%, SMD 0805; Manufacturer: YAGEO; Manufacturer Part Number: CC0805JRX7R9BB391; Package Size: 0805; JLCPCB Basic Part: No; JLCPCB Part Number: C520025; Supplier 1: LCSC; Category: Capacitors - MLCC; Supplier Part Number 1: C520025; Tolerance: ±5%; Voltage Rating: 50V; Temperature Coefficient: X7R; RoHS: Yes; ComponentLink1Description: Datasheet; ComponentLink1URL: https://wmsc.lcsc.com/wmsc/upload/file/pdf/v2/lcsc/2006011836_YAGEO-CC0805JRX7R9BB391_C520025.pdf; ComponentLink2Description: JLCPCB Part URL; ComponentLink2URL: https://jlcpcb.com/partdetail/C520025; ComponentLink3Description: LCSC Part URL; ComponentLink3URL: https://lcsc.com/product-detail/Multilayer-Ceramic-Capacitors-MLCC---SMD-SMT_YAGEO-YAGEO-CC0805JRX7R9BB391_C520025.html
footprint CAP-0805 (0805 (2012M) Capacitor)
pins: 1, 2

## CC0805JRX7R9BB392
designator C?  Capacitance: 3.9nF  (hidden comment: *)
Capacitor, Ceramic (MLCC), 3.9nF, ±5%, 50V, X7R, ±5%, SMD 0805; Manufacturer: YAGEO; Manufacturer Part Number: CC0805JRX7R9BB392; Package Size: 0805; JLCPCB Basic Part: No; JLCPCB Part Number: C520026; Supplier 1: LCSC; Category: Capacitors - MLCC; Supplier Part Number 1: C520026; Tolerance: ±5%; Voltage Rating: 50V; Temperature Coefficient: X7R; RoHS: Yes; ComponentLink1Description: Datasheet; ComponentLink1URL: https://wmsc.lcsc.com/wmsc/upload/file/pdf/v2/lcsc/2006011836_YAGEO-CC0805JRX7R9BB392_C520026.pdf; ComponentLink2Description: JLCPCB Part URL; ComponentLink2URL: https://jlcpcb.com/partdetail/C520026; ComponentLink3Description: LCSC Part URL; ComponentLink3URL: https://lcsc.com/product-detail/Multilayer-Ceramic-Capacitors-MLCC---SMD-SMT_YAGEO-YAGEO-CC0805JRX7R9BB392_C520026.html
footprint CAP-0805 (0805 (2012M) Capacitor)
pins: 1, 2

## CC0805JRX7R9BB393
designator C?  Capacitance: 39nF  (hidden comment: *)
Capacitor, Ceramic (MLCC), 39nF, ±5%, 50V, X7R, ±5%, SMD 0805; Manufacturer: YAGEO; Manufacturer Part Number: CC0805JRX7R9BB393; Package Size: 0805; JLCPCB Basic Part: No; JLCPCB Part Number: C520044; Supplier 1: LCSC; Category: Capacitors - MLCC; Supplier Part Number 1: C520044; Tolerance: ±5%; Voltage Rating: 50V; Temperature Coefficient: X7R; RoHS: Yes; ComponentLink1Description: Datasheet; ComponentLink1URL: https://wmsc.lcsc.com/wmsc/upload/file/pdf/v2/lcsc/2008191833_YAGEO-CC0805JRX7R9BB393_C520044.pdf; ComponentLink2Description: JLCPCB Part URL; ComponentLink2URL: https://jlcpcb.com/partdetail/C520044; ComponentLink3Description: LCSC Part URL; ComponentLink3URL: https://lcsc.com/product-detail/Multilayer-Ceramic-Capacitors-MLCC---SMD-SMT_YAGEO-YAGEO-CC0805JRX7R9BB393_C520044.html
footprint CAP-0805 (0805 (2012M) Capacitor)
pins: 1, 2

## CC0805JRX7R9BB471
designator C?  Capacitance: 470pF  (hidden comment: *)
Capacitor, Ceramic (MLCC), 470pF, ±5%, 50V, X7R, ±5%, SMD 0805; Manufacturer: YAGEO; Manufacturer Part Number: CC0805JRX7R9BB471; Package Size: 0805; JLCPCB Basic Part: No; JLCPCB Part Number: C520013; Supplier 1: LCSC; Category: Capacitors - MLCC; Supplier Part Number 1: C520013; Tolerance: ±5%; Voltage Rating: 50V; Temperature Coefficient: X7R; RoHS: Yes; ComponentLink1Description: Datasheet; ComponentLink1URL: https://wmsc.lcsc.com/wmsc/upload/file/pdf/v2/lcsc/2007101234_YAGEO-CC0805JRX7R9BB471_C520013.pdf; ComponentLink2Description: JLCPCB Part URL; ComponentLink2URL: https://jlcpcb.com/partdetail/C520013; ComponentLink3Description: LCSC Part URL; ComponentLink3URL: https://lcsc.com/product-detail/Multilayer-Ceramic-Capacitors-MLCC---SMD-SMT_YAGEO-YAGEO-CC0805JRX7R9BB471_C520013.html
footprint CAP-0805 (0805 (2012M) Capacitor)
pins: 1, 2

## CC0805JRX7R9BB472
designator C?  Capacitance: 4.7nF  (hidden comment: *)
Capacitor, Ceramic (MLCC), 4.7nF, ±5%, 50V, X7R, ±5%, SMD 0805; Manufacturer: YAGEO; Manufacturer Part Number: CC0805JRX7R9BB472; Package Size: 0805; JLCPCB Basic Part: No; JLCPCB Part Number: C327170; Supplier 1: LCSC; Category: Capacitors - MLCC; Supplier Part Number 1: C327170; Tolerance: ±5%; Voltage Rating: 50V; Temperature Coefficient: X7R; RoHS: Yes; ComponentLink1Description: Datasheet; ComponentLink1URL: https://wmsc.lcsc.com/wmsc/upload/file/pdf/v2/lcsc/2311211121_YAGEO-CC0805JRX7R9BB472_C327170.pdf; ComponentLink2Description: JLCPCB Part URL; ComponentLink2URL: https://jlcpcb.com/partdetail/C327170; ComponentLink3Description: LCSC Part URL; ComponentLink3URL: https://lcsc.com/product-detail/Multilayer-Ceramic-Capacitors-MLCC---SMD-SMT_YAGEO-YAGEO-CC0805JRX7R9BB472_C327170.html
footprint CAP-0805 (0805 (2012M) Capacitor)
pins: 1, 2

## CC0805JRX7R9BB473
designator C?  Capacitance: 47nF  (hidden comment: *)
Capacitor, Ceramic (MLCC), 47nF, ±5%, 50V, X7R, ±5%, SMD 0805; Manufacturer: YAGEO; Manufacturer Part Number: CC0805JRX7R9BB473; Package Size: 0805; JLCPCB Basic Part: No; JLCPCB Part Number: C326712; Supplier 1: LCSC; Category: Capacitors - MLCC; Supplier Part Number 1: C326712; Tolerance: ±5%; Voltage Rating: 50V; Temperature Coefficient: X7R; RoHS: Yes; ComponentLink1Description: Datasheet; ComponentLink1URL: https://wmsc.lcsc.com/wmsc/upload/file/pdf/v2/lcsc/2311211121_YAGEO-CC0805JRX7R9BB473_C326712.pdf; ComponentLink2Description: JLCPCB Part URL; ComponentLink2URL: https://jlcpcb.com/partdetail/C326712; ComponentLink3Description: LCSC Part URL; ComponentLink3URL: https://lcsc.com/product-detail/Multilayer-Ceramic-Capacitors-MLCC---SMD-SMT_YAGEO-YAGEO-CC0805JRX7R9BB473_C326712.html
footprint CAP-0805 (0805 (2012M) Capacitor)
pins: 1, 2

## CC0805JRX7R9BB561
designator C?  Capacitance: 560pF  (hidden comment: *)
Capacitor, Ceramic (MLCC), 560pF, ±5%, 50V, X7R, ±5%, SMD 0805; Manufacturer: YAGEO; Manufacturer Part Number: CC0805JRX7R9BB561; Package Size: 0805; JLCPCB Basic Part: No; JLCPCB Part Number: C520027; Supplier 1: LCSC; Category: Capacitors - MLCC; Supplier Part Number 1: C520027; Tolerance: ±5%; Voltage Rating: 50V; Temperature Coefficient: X7R; RoHS: Yes; ComponentLink1Description: Datasheet; ComponentLink1URL: https://wmsc.lcsc.com/wmsc/upload/file/pdf/v2/lcsc/2007231534_YAGEO-CC0805JRX7R9BB561_C520027.pdf; ComponentLink2Description: JLCPCB Part URL; ComponentLink2URL: https://jlcpcb.com/partdetail/C520027; ComponentLink3Description: LCSC Part URL; ComponentLink3URL: https://lcsc.com/product-detail/Multilayer-Ceramic-Capacitors-MLCC---SMD-SMT_YAGEO-YAGEO-CC0805JRX7R9BB561_C520027.html
footprint CAP-0805 (0805 (2012M) Capacitor)
pins: 1, 2

## CC0805JRX7R9BB562
designator C?  Capacitance: 5.6nF  (hidden comment: *)
Capacitor, Ceramic (MLCC), 5.6nF, ±5%, 50V, X7R, ±5%, SMD 0805; Manufacturer: YAGEO; Manufacturer Part Number: CC0805JRX7R9BB562; Package Size: 0805; JLCPCB Basic Part: No; JLCPCB Part Number: C520028; Supplier 1: LCSC; Category: Capacitors - MLCC; Supplier Part Number 1: C520028; Tolerance: ±5%; Voltage Rating: 50V; Temperature Coefficient: X7R; RoHS: Yes; ComponentLink1Description: Datasheet; ComponentLink1URL: https://wmsc.lcsc.com/wmsc/upload/file/pdf/v2/lcsc/2006011836_YAGEO-CC0805JRX7R9BB562_C520028.pdf; ComponentLink2Description: JLCPCB Part URL; ComponentLink2URL: https://jlcpcb.com/partdetail/C520028; ComponentLink3Description: LCSC Part URL; ComponentLink3URL: https://lcsc.com/product-detail/Multilayer-Ceramic-Capacitors-MLCC---SMD-SMT_YAGEO-YAGEO-CC0805JRX7R9BB562_C520028.html
footprint CAP-0805 (0805 (2012M) Capacitor)
pins: 1, 2

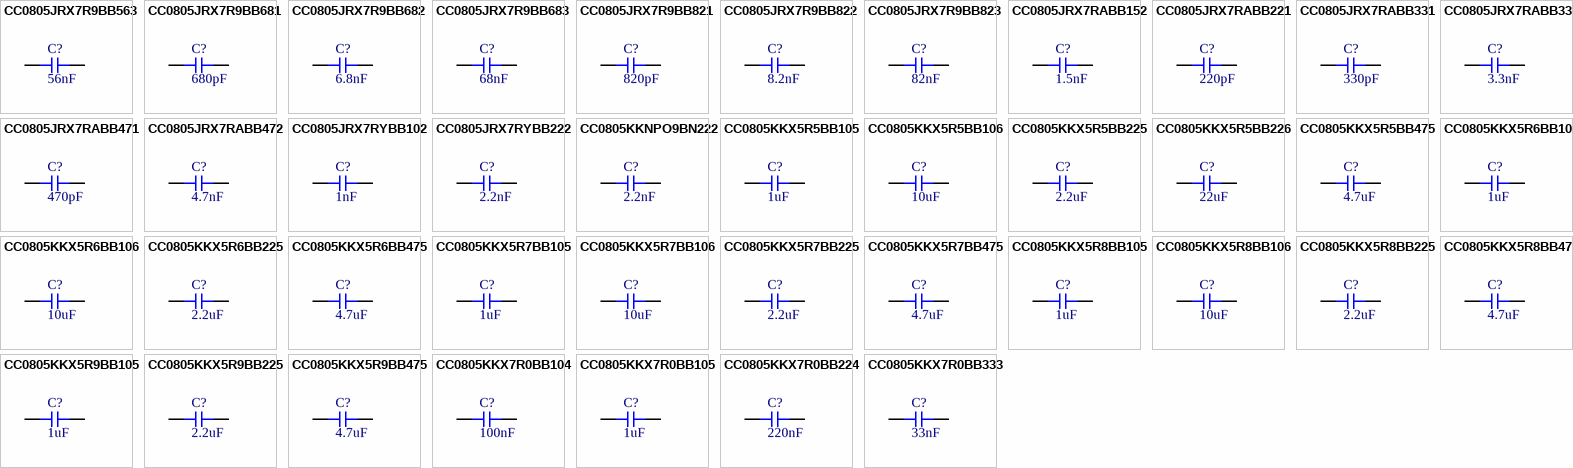
[diagram p39: symbols CC0805JRX7R9BB563 to CC0805KKX7R0BB333]

## CC0805JRX7R9BB563
designator C?  Capacitance: 56nF  (hidden comment: *)
Capacitor, Ceramic (MLCC), 56nF, ±5%, 50V, X7R, ±5%, SMD 0805; Manufacturer: YAGEO; Manufacturer Part Number: CC0805JRX7R9BB563; Package Size: 0805; JLCPCB Basic Part: No; JLCPCB Part Number: C520045; Supplier 1: LCSC; Category: Capacitors - MLCC; Supplier Part Number 1: C520045; Tolerance: ±5%; Voltage Rating: 50V; Temperature Coefficient: X7R; RoHS: Yes; ComponentLink1Description: Datasheet; ComponentLink1URL: https://wmsc.lcsc.com/wmsc/upload/file/pdf/v2/lcsc/2006011836_YAGEO-CC0805JRX7R9BB563_C520045.pdf; ComponentLink2Description: JLCPCB Part URL; ComponentLink2URL: https://jlcpcb.com/partdetail/C520045; ComponentLink3Description: LCSC Part URL; ComponentLink3URL: https://lcsc.com/product-detail/Multilayer-Ceramic-Capacitors-MLCC---SMD-SMT_YAGEO-YAGEO-CC0805JRX7R9BB563_C520045.html
footprint CAP-0805 (0805 (2012M) Capacitor)
pins: 1, 2
